# Altium footprint library ParsaLibrary.PcbLib: 526 footprints (part 14 of 33)
Each footprint in its own frame and in the unit in brackets; x right, y up, seen from the top. Pads: shape width x height; smd on the part's side, far side on the other; paste and mask are expansions set on the pad; w line width, h text height; cw(c..) or ccw(c..) is an arc to the next point about the centre after c.
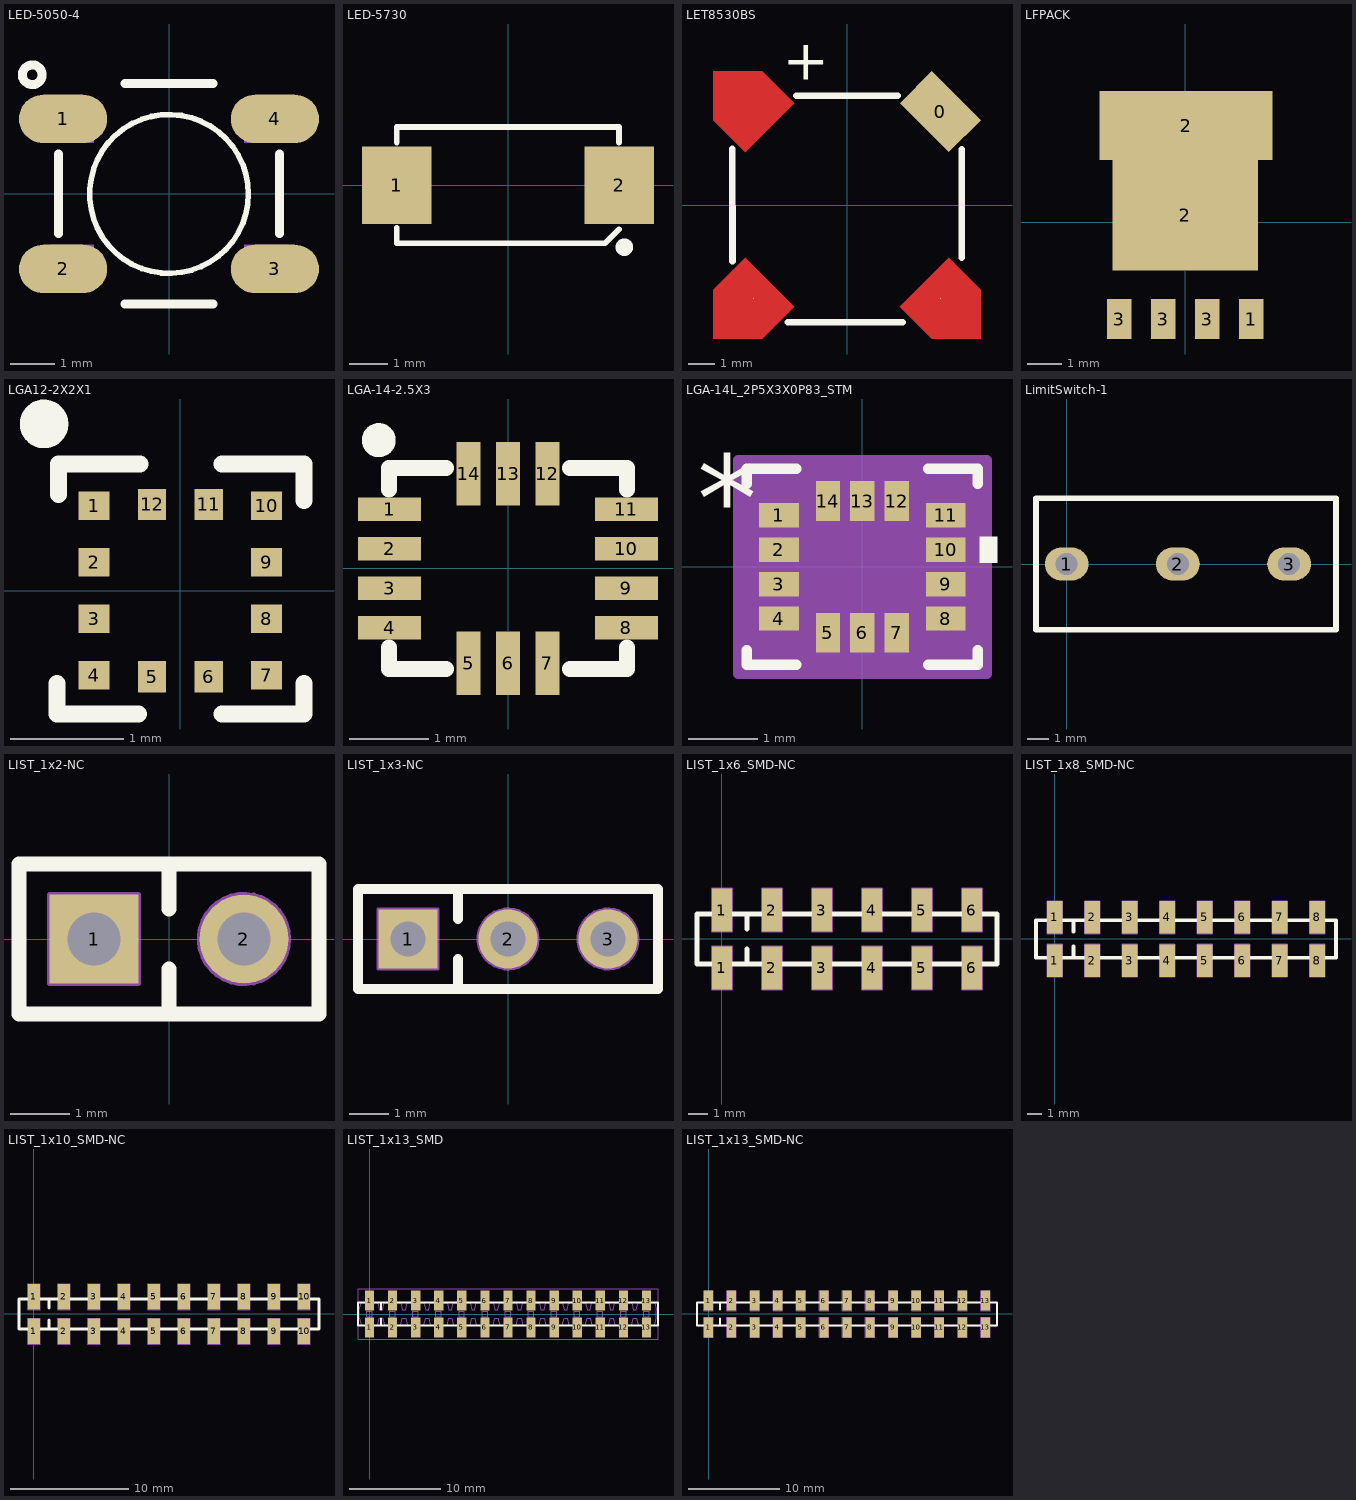
[diagram p13: the footprints below, top view; thin cyan lines are the x and y axes]

## LED-5050-4 [mm]
pads (4):
  rrect100% 2x1.1 smd: 1(-2.4,1.7) 2(-2.4,-1.7) 3(2.4,-1.7) 4(2.4,1.7)
Top Overlay:
  circle w0.203: c-3.1,2.7 r0.224
  circle w0.127: c0,0 r1.8
  lines w0.203: -2.5,-0.9 -2.5,-0.7 -2.5,0.9 ; -1,-2.5 1,-2.5 ; -1,2.5 1,2.5 ; 2.5,-0.9 2.5,-0.7 2.5,0.9
Mechanical 16:
  rectangle: 1.7,1.15 2.7,2.05
  rectangle: 1.7,-2.05 2.7,-1.15
  region: -1.7,2.05 -2.7,2.05 -2.7,1.15 -1.7,1.15
  region: -1.7,-1.15 -2.7,-1.15 -2.7,-2.05 -1.7,-2.05
3D body "User Library-ws2812B-1.step": height 1.6, standoff 0.03, extent -2.7,-2.5 2.7,2.5

## LED-5730 [mm]
pads (2):
  rect 1.8x2 smd: 1(-2.867,0) 2(2.867,0)
Top Overlay:
  circle w0.254: c3,-1.6 r0.1
  lines w0.15: -2.867,-1.1 -2.867,-1.5 2.5,-1.5 2.862,-1.138 ; -2.867,1.1 -2.867,1.5 2.862,1.5 2.862,1.1
Top Solder:
  rectangle: -1.7,-0.8 0.9,0.8
3D body "User Library-PLCC-2white.step": height 0.9, standoff 0, extent -2.85,-1.5 2.85,1.5

## Lens-Holder [mm]
3D body "Camera ABM-S420.SLDPRT": height 25, standoff -6, extent -16.76,-14.732 15.24,17.268

## LET8530BS [mm]
pads (4):
  round 0.025 smd: 0(3.5,-3.5) 1(-3.5,-3.5) 2(-3.5,3.5)
  rect 2.6x1.7 smd rot 135: 0(3.5,3.5)
Top Layer:
  region: 5.02,-3.182 5.02,-5.021 3.182,-5.02 1.98,-3.818 3.818,-1.98
  region: -3.182,-5.02 -5.021,-5.02 -5.02,-3.182 -3.818,-1.98 -1.98,-3.818
  region: -5.02,3.182 -5.02,5.02 -3.182,5.02 -1.98,3.818 -3.818,1.98
Top Overlay:
  lines w0.254: -4.3,2.1 -4.293,-2.108 ; -2.21,-4.394 2.083,-4.394 ; -1.9,4.1 1.9,4.1 ; 4.301,-1.975 4.301,2.091
  text "+" at -2.4,4.7 h1.52
3D body "GSC8530YA-16R2700.STEP": height 3, standoff -0.15, extent -4.25,-4.25 4.3,4.25

## LFPACK [mm]
pads (6):
  rect 0.7x1.15 smd: 1(1.905,-2.794) 3(-1.905,-2.794) 3(-0.635,-2.794) 3(0.635,-2.794)
  rect 4.2x3.2 smd: 2(0,0.206)
  rect 5x2 smd: 2(0.025,2.794)
3D body "lfpak.STEP": height 1.1, standoff -0.01, extent -2.485,-3.126 2.515,3.343

## LGA12-2X2X1 [mm]
height 1
pads (12):
  rect 0.275x0.25 smd: 1(-0.762,0.75) 2(-0.762,0.25) 3(-0.762,-0.25) 4(-0.762,-0.75) 7(0.763,-0.75) 8(0.763,-0.25) 9(0.763,0.25) 10(0.763,0.75)
  rect 0.25x0.275 smd: 5(-0.25,-0.763) 6(0.25,-0.763) 11(0.25,0.763) 12(-0.25,0.763)
Top Overlay:
  circle w0.254: c-1.206,1.473 r0.088
  lines w0.15: -1.092,-0.82 -1.092,-1.092 -0.37,-1.092 ; -1.078,0.848 -1.078,1.12 -0.356,1.12 ; 0.37,-1.092 1.092,-1.092 1.092,-0.82 ; 0.37,1.118 1.092,1.118 1.092,0.796
3D body "User Library-LGA12_2x2_E0P5.step": height 0.7, standoff 0, extent -1,-1 1,1

## LGA-14-2.5X3 [mm]
pads (14):
  rect 0.8x0.3 smd: 1(-1.5,0.75) 2(-1.5,0.25) 3(-1.5,-0.25) 4(-1.5,-0.75) 8(1.5,-0.75) 9(1.5,-0.25) 10(1.5,0.25) 11(1.5,0.75)
  rect 0.3x0.8 smd: 5(-0.5,-1.2) 6(0,-1.2) 7(0.5,-1.2) 12(0.5,1.2) 13(0,1.2) 14(-0.5,1.2)
Top Overlay:
  circle w0.254: c-1.637,1.625 r0.088
  lines w0.2: -1.509,-1 -1.509,-1.272 -0.787,-1.272 ; -1.509,1 -1.509,1.272 -0.787,1.272 ; 0.787,-1.272 1.509,-1.272 1.509,-1 ; 0.787,1.272 1.509,1.272 1.509,1
3D body "User Library-LGA-14 2_5x3-1.step": height 0.9, standoff 0.04, extent -1.509,-1.245 1.491,1.255

## LGA-14L_2P5X3X0P83_STM [mm]
pads (14):
  rect 0.577x0.352 smd paste+0 mask+0.102: 1(-1.21,0.75) 2(-1.21,0.25) 3(-1.21,-0.25) 4(-1.21,-0.75) 8(1.21,-0.75) 9(1.21,-0.25) 10(1.21,0.25) 11(1.21,0.75)
  rect 0.352x0.577 smd paste+0 mask+0.102: 5(-0.5,-0.956) 6(0,-0.956) 7(0.5,-0.956) 12(0.5,0.956) 13(0,0.956) 14(-0.5,0.956)
Top Overlay:
  region: 1.702,0.44 1.956,0.44 1.956,0.059 1.702,0.059
  lines w0.152: -1.676,-1.207 -1.676,-1.422 -0.957,-1.422 ; -1.676,1.207 -1.676,1.422 -0.957,1.422 ; 0.957,-1.422 1.676,-1.422 1.676,-1.207 ; 0.957,1.422 1.676,1.422 1.676,1.207
  text "*" at -2.4,0.365 h1.27
Mechanical 13:
  lines w0.025: -1.549,0.025 -0.279,1.295 ; -1.549,-1.295 1.549,-1.295 1.549,1.295 -1.549,1.295 -1.549,-1.295 ; -1.549,-0.875 -1.549,-0.625 -1.448,-0.625 -1.448,-0.875 -1.549,-0.875 ; -1.549,-0.375 -1.549,-0.125 -1.448,-0.125 -1.448,-0.375 -1.549,-0.375 ; -1.549,0.125 -1.549,0.375 -1.448,0.375 -1.448,0.125 -1.549,0.125 ; -1.549,0.625 -1.549,0.875 -1.448,0.875 -1.448,0.625 -1.549,0.625 ; -0.625,-1.295 -0.375,-1.295 -0.375,-1.194 -0.625,-1.194 -0.625,-1.295 ; -0.625,1.194 -0.375,1.194 -0.375,1.295 -0.625,1.295 -0.625,1.194 ; -0.125,-1.295 0.125,-1.295 0.125,-1.194 -0.125,-1.194 -0.125,-1.295 ; -0.125,1.194 0.125,1.194 0.125,1.295 -0.125,1.295 -0.125,1.194 ; 0.375,-1.295 0.625,-1.295 0.625,-1.194 0.375,-1.194 0.375,-1.295 ; 0.375,1.194 0.625,1.194 0.625,1.295 0.375,1.295 0.375,1.194 ; 1.448,-0.875 1.549,-0.875 1.549,-0.625 1.448,-0.625 1.448,-0.875 ; 1.448,-0.375 1.549,-0.375 1.549,-0.125 1.448,-0.125 1.448,-0.375 ; 1.448,0.125 1.549,0.125 1.549,0.375 1.448,0.375 1.448,0.125 ; 1.448,0.625 1.549,0.625 1.549,0.875 1.448,0.875 1.448,0.625
  text "*" at -1.29,0.365 h1.27
Mechanical 15:
  region: -0.879,-1.549 -1.803,-1.549 -1.803,-1.129 -1.803,1.129 -1.803,1.549 -0.879,1.549 0.879,1.549 1.803,1.549 1.803,1.129 1.803,-1.129 1.803,-1.549 0.879,-1.549
  lines w0.152: -1.803,-1.549 -1.803,-1.129 -1.803,1.129 -1.803,1.549 -0.879,1.549 0.879,1.549 1.803,1.549 1.803,1.129 1.803,-1.129 1.803,-1.549 0.879,-1.549 -0.879,-1.549 -1.803,-1.549
3D body "LGA-14L_2P5X3X0P83_STM.step": height 0.87, standoff 0, extent -1.549,-1.295 1.549,1.295

## LimitSwitch-1 [mm] "12mmx12mm"
height 10
pads (3):
  oval 2x1.5 hole 1: 1(0,0) 2(5.08,0) 3(10.16,0)
Top Overlay:
  lines w0.254: -1.4,-3 12.3,-3 12.3,3 -1.4,3 -1.4,-3
3D body "D2F-01L.STEP": height 8.93, standoff -5, extent -1.32,-2.9 12.202,2.9

## LIST_1x2-NC [mm]
pads (2):
  rect 1.5x1.5 hole 0.9: 1(-1.27,0)
  round 1.5 hole 0.9: 2(1.27,0)
Top Overlay:
  lines w0.254: 0,-1.27 0,-0.508 ; 0,0.508 0,1.27 ; -2.54,-1.27 2.54,-1.27 2.54,1.27 -2.54,1.27 -2.54,-1.27
Mechanical 7:
  circle w0.1: c1.27,0 r0.75
  circle w0.1: c1.27,0 r0.45
  circle w0.1: c-1.27,0 r0.45
  lines w0.1: 0,-1.27 0,-0.508 ; 0,0.508 0,1.27 ; -2.54,-1.27 2.54,-1.27 2.54,1.27 -2.54,1.27 -2.54,-1.27 ; -2.02,-0.75 -0.52,-0.75 -0.52,0.75 -2.02,0.75 -2.02,-0.75
  text ".Designator" at -0.4,-0.2 h0.38
Mechanical 8:
  circle w0.1: c-1.27,0 r0.45
  circle w0.1: c1.27,0 r0.45
  circle w0.1: c1.27,0 r0.75
  lines w0.1: -2.02,-0.75 -2.02,0.75 -0.52,0.75 -0.52,-0.75 -2.02,-0.75

## LIST_1x3-NC [mm]
pads (3):
  rect 1.5x1.5 hole 0.9: 1(-2.54,0)
  round 1.5 hole 0.9: 2(0,0) 3(2.54,0)
Top Overlay:
  lines w0.254: -1.27,-1.27 -1.27,-0.508 ; -1.27,0.508 -1.27,1.27 ; -3.81,-1.27 -3.81,1.27 3.81,1.27 3.81,-1.27 -3.81,-1.27
Mechanical 7:
  circle w0.1: c0,0 r0.75
  circle w0.1: c0,0 r0.45
  circle w0.1: c-2.54,0 r0.45
  circle w0.1: c2.54,0 r0.45
  circle w0.1: c2.54,0 r0.75
  lines w0.1: -1.27,-1.27 -1.27,-0.508 ; -1.27,0.508 -1.27,1.27 ; -3.81,-1.27 -3.81,1.27 3.81,1.27 3.81,-1.27 -3.81,-1.27 ; -3.29,-0.75 -1.79,-0.75 -1.79,0.75 -3.29,0.75 -3.29,-0.75
  text ".Designator" at -2.04,-0.2 h0.38

## LIST_1x6_SMD-NC [mm]
pads (12):
  rect 1.02x2.19 smd paste+0: 1(0,-1.465) 1(0,1.465) 2(2.54,-1.465) 2(2.54,1.465) 3(5.08,-1.465) 3(5.08,1.465) 4(7.62,-1.465) 4(7.62,1.465) 5(10.16,-1.465) 5(10.16,1.465) 6(12.7,-1.465) 6(12.7,1.465)
Top Overlay:
  lines w0.254: 1.27,-1.27 1.27,-0.508 ; 1.27,0.508 1.27,1.27 ; -1.27,-1.27 -1.27,1.27 13.97,1.27 13.97,-1.27 -1.27,-1.27
Mechanical 7:
  lines w0.1: -0.686,-1.27 -1.27,-1.27 -1.27,1.27 -0.686,1.27 ; 0.686,-1.27 1.854,-1.27 ; 0.686,1.27 1.854,1.27 ; 1.27,-1.27 1.27,-0.508 ; 1.27,0.508 1.27,1.27 ; 3.226,-1.27 4.394,-1.27 ; 3.226,1.27 4.394,1.27 ; 5.766,-1.27 6.934,-1.27 ; 5.766,1.27 6.934,1.27 ; 8.306,-1.27 9.474,-1.27 ; 8.306,1.27 9.474,1.27 ; 10.846,-1.27 12.014,-1.27 ; 10.846,1.27 12.014,1.27 ; 13.386,-1.27 13.97,-1.27 13.97,1.27 13.386,1.27 ; -0.51,-2.56 -0.51,-0.37 0.51,-0.37 0.51,-2.56 -0.51,-2.56 ; -0.51,0.37 0.51,0.37 0.51,2.56 -0.51,2.56 -0.51,0.37 ; 2.03,-2.56 2.03,-0.37 3.05,-0.37 3.05,-2.56 2.03,-2.56 ; 2.03,0.37 2.03,2.56 3.05,2.56 3.05,0.37 2.03,0.37 ; 4.57,-2.56 4.57,-0.37 5.59,-0.37 5.59,-2.56 4.57,-2.56 ; 4.57,0.37 4.57,2.56 5.59,2.56 5.59,0.37 4.57,0.37 ; 7.11,-2.56 7.11,-0.37 8.13,-0.37 8.13,-2.56 7.11,-2.56 ; 7.11,0.37 7.11,2.56 8.13,2.56 8.13,0.37 7.11,0.37 ; 9.65,-2.56 9.65,-0.37 10.67,-0.37 10.67,-2.56 9.65,-2.56 ; 9.65,0.37 9.65,2.56 10.67,2.56 10.67,0.37 9.65,0.37 ; 12.19,-2.56 12.19,-0.37 13.21,-0.37 13.21,-2.56 12.19,-2.56 ; 12.19,0.37 12.19,2.56 13.21,2.56 13.21,0.37 12.19,0.37
  text ".Designator" at 0.5,-0.2 h0.38

## LIST_1x8_SMD-NC [mm]
pads (16):
  rect 1.02x2.19 smd paste+0: 1(0,-1.465) 1(0,1.465) 2(2.54,-1.465) 2(2.54,1.465) 3(5.08,-1.465) 3(5.08,1.465) 4(7.62,-1.465) 4(7.62,1.465) 5(10.16,-1.465) 5(10.16,1.465) 6(12.7,-1.465) 6(12.7,1.465) 7(15.24,-1.465) 7(15.24,1.465) 8(17.78,-1.465) 8(17.78,1.465)
Top Overlay:
  lines w0.254: 1.27,-1.27 1.27,-0.508 ; 1.27,0.508 1.27,1.27 ; -1.27,-1.27 19.05,-1.27 19.05,1.27 -1.27,1.27 -1.27,-1.27
Mechanical 7:
  lines w0.1: -0.686,-1.27 -1.27,-1.27 -1.27,1.27 -0.686,1.27 ; 0.686,-1.27 1.854,-1.27 ; 0.686,1.27 1.854,1.27 ; 1.27,-1.27 1.27,-0.508 ; 1.27,0.508 1.27,1.27 ; 3.226,-1.27 4.394,-1.27 ; 3.226,1.27 4.394,1.27 ; 5.766,-1.27 6.934,-1.27 ; 5.766,1.27 6.934,1.27 ; 8.306,-1.27 9.474,-1.27 ; 8.306,1.27 9.474,1.27 ; 10.846,-1.27 12.014,-1.27 ; 10.846,1.27 12.014,1.27 ; 13.386,-1.27 14.554,-1.27 ; 13.386,1.27 14.554,1.27 ; 15.926,-1.27 17.094,-1.27 ; 15.926,1.27 17.094,1.27 ; 18.466,-1.27 19.05,-1.27 19.05,1.27 18.466,1.27 ; -0.51,-2.56 0.51,-2.56 0.51,-0.37 -0.51,-0.37 -0.51,-2.56 ; -0.51,0.37 -0.51,2.56 0.51,2.56 0.51,0.37 -0.51,0.37 ; 2.03,-2.56 3.05,-2.56 3.05,-0.37 2.03,-0.37 2.03,-2.56 ; 2.03,0.37 3.05,0.37 3.05,2.56 2.03,2.56 2.03,0.37 ; 4.57,-2.56 5.59,-2.56 5.59,-0.37 4.57,-0.37 4.57,-2.56 ; 4.57,0.37 5.59,0.37 5.59,2.56 4.57,2.56 4.57,0.37 ; 7.11,-2.56 8.13,-2.56 8.13,-0.37 7.11,-0.37 7.11,-2.56 ; 7.11,0.37 8.13,0.37 8.13,2.56 7.11,2.56 7.11,0.37 ; 9.65,-2.56 10.67,-2.56 10.67,-0.37 9.65,-0.37 9.65,-2.56 ; 9.65,0.37 10.67,0.37 10.67,2.56 9.65,2.56 9.65,0.37 ; 12.19,-2.56 13.21,-2.56 13.21,-0.37 12.19,-0.37 12.19,-2.56 ; 12.19,0.37 13.21,0.37 13.21,2.56 12.19,2.56 12.19,0.37 ; 14.73,-2.56 15.75,-2.56 15.75,-0.37 14.73,-0.37 14.73,-2.56 ; 14.73,0.37 15.75,0.37 15.75,2.56 14.73,2.56 14.73,0.37 ; 17.27,-2.56 18.29,-2.56 18.29,-0.37 17.27,-0.37 17.27,-2.56 ; 17.27,0.37 18.29,0.37 18.29,2.56 17.27,2.56 17.27,0.37
  text ".Designator" at 0.5,-0.2 h0.38

## LIST_1x10_SMD-NC [mm]
pads (20):
  rect 1.02x2.19 smd paste+0: 1(0,-1.465) 1(0,1.465) 2(2.54,-1.465) 2(2.54,1.465) 3(5.08,-1.465) 3(5.08,1.465) 4(7.62,-1.465) 4(7.62,1.465) 5(10.16,-1.465) 5(10.16,1.465) 6(12.7,-1.465) 6(12.7,1.465) 7(15.24,-1.465) 7(15.24,1.465) 8(17.78,-1.465) 8(17.78,1.465) 9(20.32,-1.465) 9(20.32,1.465) 10(22.86,-1.465) 10(22.86,1.465)
Top Overlay:
  lines w0.254: 1.27,-1.27 1.27,-0.508 ; 1.27,0.508 1.27,1.27 ; -1.27,-1.27 -1.27,1.27 24.13,1.27 24.13,-1.27 -1.27,-1.27
Mechanical 7:
  lines w0.1: -0.686,-1.27 -1.27,-1.27 -1.27,1.27 -0.686,1.27 ; 0.686,-1.27 1.854,-1.27 ; 0.686,1.27 1.854,1.27 ; 1.27,-1.27 1.27,-0.508 ; 1.27,0.508 1.27,1.27 ; 3.226,-1.27 4.394,-1.27 ; 3.226,1.27 4.394,1.27 ; 5.766,-1.27 6.934,-1.27 ; 5.766,1.27 6.934,1.27 ; 8.306,-1.27 9.474,-1.27 ; 8.306,1.27 9.474,1.27 ; 10.846,-1.27 12.014,-1.27 ; 10.846,1.27 12.014,1.27 ; 13.386,-1.27 14.554,-1.27 ; 13.386,1.27 14.554,1.27 ; 15.926,-1.27 17.094,-1.27 ; 15.926,1.27 17.094,1.27 ; 18.466,-1.27 19.634,-1.27 ; 18.466,1.27 19.634,1.27 ; 21.006,-1.27 22.174,-1.27 ; 21.006,1.27 22.174,1.27 ; 23.546,-1.27 24.13,-1.27 24.13,1.27 23.546,1.27 ; -0.51,-2.56 -0.51,-0.37 0.51,-0.37 0.51,-2.56 -0.51,-2.56 ; -0.51,0.37 0.51,0.37 0.51,2.56 -0.51,2.56 -0.51,0.37 ; 2.03,-2.56 2.03,-0.37 3.05,-0.37 3.05,-2.56 2.03,-2.56 ; 2.03,0.37 2.03,2.56 3.05,2.56 3.05,0.37 2.03,0.37 ; 4.57,-2.56 4.57,-0.37 5.59,-0.37 5.59,-2.56 4.57,-2.56 ; 4.57,0.37 4.57,2.56 5.59,2.56 5.59,0.37 4.57,0.37 ; 7.11,-2.56 7.11,-0.37 8.13,-0.37 8.13,-2.56 7.11,-2.56 ; 7.11,0.37 7.11,2.56 8.13,2.56 8.13,0.37 7.11,0.37 ; 9.65,-2.56 9.65,-0.37 10.67,-0.37 10.67,-2.56 9.65,-2.56 ; 9.65,0.37 9.65,2.56 10.67,2.56 10.67,0.37 9.65,0.37 ; 12.19,-2.56 12.19,-0.37 13.21,-0.37 13.21,-2.56 12.19,-2.56 ; 12.19,0.37 12.19,2.56 13.21,2.56 13.21,0.37 12.19,0.37 ; 14.73,-2.56 14.73,-0.37 15.75,-0.37 15.75,-2.56 14.73,-2.56 ; 14.73,0.37 14.73,2.56 15.75,2.56 15.75,0.37 14.73,0.37 ; 17.27,-2.56 17.27,-0.37 18.29,-0.37 18.29,-2.56 17.27,-2.56 ; 17.27,0.37 17.27,2.56 18.29,2.56 18.29,0.37 17.27,0.37 ; 19.81,-2.56 20.83,-2.56 20.83,-0.37 19.81,-0.37 19.81,-2.56 ; 19.81,0.37 20.83,0.37 20.83,2.56 19.81,2.56 19.81,0.37 ; 22.35,-2.56 23.37,-2.56 23.37,-0.37 22.35,-0.37 22.35,-2.56 ; 22.35,0.37 23.37,0.37 23.37,2.56 22.35,2.56 22.35,0.37
  text ".Designator" at 0.5,-0.2 h0.38

## LIST_1x13_SMD [mm]
pads (26):
  rect 1.02x2.19 smd: 1(0,-1.465) 1(0,1.465) 2(2.54,-1.465) 2(2.54,1.465) 3(5.08,-1.465) 3(5.08,1.465) 4(7.62,-1.465) 4(7.62,1.465) 5(10.16,-1.465) 5(10.16,1.465) 6(12.7,-1.465) 6(12.7,1.465) 7(15.24,-1.465) 7(15.24,1.465) 8(17.78,-1.465) 8(17.78,1.465) 9(20.32,-1.465) 9(20.32,1.465) 10(22.86,-1.465) 10(22.86,1.465) 11(25.4,-1.465) 11(25.4,1.465) 12(27.94,-1.465) 12(27.94,1.465) 13(30.48,-1.465) 13(30.48,1.465)
Top Overlay:
  lines w0.254: 1.27,-1.27 1.27,-0.508 ; 1.27,0.508 1.27,1.27 ; -1.27,-1.27 31.75,-1.27 31.75,1.27 -1.27,1.27 -1.27,-1.27
Mechanical 7:
  drawing of 195 lines, arcs and shapes, not listed
  text ".Designator" at 0.5,-0.2 h0.38
Mechanical 15:
  lines w0.1: -1.27,-2.8 -1.27,2.8 31.75,2.8 31.75,-2.8 -1.27,-2.8
3D body "pin_header_a-sl254-eg-g13mp1.stp": height 9.82, standoff -0.02, extent -1.27,-2.5 31.75,2.5

## LIST_1x13_SMD-NC [mm]
pads (26):
  rect 1.02x2.19 smd: 1(0,-1.465) 1(0,1.465) 2(2.54,-1.465) 2(2.54,1.465) 3(5.08,-1.465) 3(5.08,1.465) 4(7.62,-1.465) 4(7.62,1.465) 5(10.16,-1.465) 5(10.16,1.465) 6(12.7,-1.465) 6(12.7,1.465) 7(15.24,-1.465) 7(15.24,1.465) 8(17.78,-1.465) 8(17.78,1.465) 9(20.32,-1.465) 9(20.32,1.465) 10(22.86,-1.465) 10(22.86,1.465) 11(25.4,-1.465) 11(25.4,1.465) 12(27.94,-1.465) 12(27.94,1.465) 13(30.48,-1.465) 13(30.48,1.465)
Top Overlay:
  lines w0.254: 1.27,-1.27 1.27,-0.508 ; 1.27,0.508 1.27,1.27 ; -1.27,-1.27 31.75,-1.27 31.75,1.27 -1.27,1.27 -1.27,-1.27
Mechanical 7:
  lines w0.1: -0.686,-1.27 -1.27,-1.27 -1.27,1.27 -0.686,1.27 ; 0.686,-1.27 1.854,-1.27 ; 0.686,1.27 1.854,1.27 ; 1.27,-1.27 1.27,-0.508 ; 1.27,0.508 1.27,1.27 ; 3.226,-1.27 4.394,-1.27 ; 3.226,1.27 4.394,1.27 ; 5.766,-1.27 6.934,-1.27 ; 5.766,1.27 6.934,1.27 ; 8.306,-1.27 9.474,-1.27 ; 8.306,1.27 9.474,1.27 ; 10.846,-1.27 12.014,-1.27 ; 10.846,1.27 12.014,1.27 ; 13.386,-1.27 14.554,-1.27 ; 13.386,1.27 14.554,1.27 ; 15.926,-1.27 17.094,-1.27 ; 15.926,1.27 17.094,1.27 ; 18.466,-1.27 19.634,-1.27 ; 18.466,1.27 19.634,1.27 ; 21.006,-1.27 22.174,-1.27 ; 21.006,1.27 22.174,1.27 ; 23.546,-1.27 24.714,-1.27 ; 23.546,1.27 24.714,1.27 ; 26.086,-1.27 27.254,-1.27 ; 26.086,1.27 27.254,1.27 ; 28.626,-1.27 29.794,-1.27 ; 28.626,1.27 29.794,1.27 ; 31.166,-1.27 31.75,-1.27 31.75,1.27 31.166,1.27 ; -0.51,-2.56 0.51,-2.56 0.51,-0.37 -0.51,-0.37 -0.51,-2.56 ; -0.51,0.37 -0.51,2.56 0.51,2.56 0.51,0.37 -0.51,0.37 ; 2.03,-2.56 3.05,-2.56 3.05,-0.37 2.03,-0.37 2.03,-2.56 ; 2.03,0.37 3.05,0.37 3.05,2.56 2.03,2.56 2.03,0.37 ; 4.57,-2.56 5.59,-2.56 5.59,-0.37 4.57,-0.37 4.57,-2.56 ; 4.57,0.37 5.59,0.37 5.59,2.56 4.57,2.56 4.57,0.37 ; 7.11,-2.56 8.13,-2.56 8.13,-0.37 7.11,-0.37 7.11,-2.56 ; 7.11,0.37 8.13,0.37 8.13,2.56 7.11,2.56 7.11,0.37 ; 9.65,-2.56 10.67,-2.56 10.67,-0.37 9.65,-0.37 9.65,-2.56 ; 9.65,0.37 10.67,0.37 10.67,2.56 9.65,2.56 9.65,0.37 ; 12.19,-2.56 13.21,-2.56 13.21,-0.37 12.19,-0.37 12.19,-2.56 ; 12.19,0.37 13.21,0.37 13.21,2.56 12.19,2.56 12.19,0.37 ; 14.73,-2.56 15.75,-2.56 15.75,-0.37 14.73,-0.37 14.73,-2.56 ; 14.73,0.37 15.75,0.37 15.75,2.56 14.73,2.56 14.73,0.37 ; 17.27,-2.56 18.29,-2.56 18.29,-0.37 17.27,-0.37 17.27,-2.56 ; 17.27,0.37 18.29,0.37 18.29,2.56 17.27,2.56 17.27,0.37 ; 19.81,-2.56 19.81,-0.37 20.83,-0.37 20.83,-2.56 19.81,-2.56 ; 19.81,0.37 19.81,2.56 20.83,2.56 20.83,0.37 19.81,0.37 ; 22.35,-2.56 22.35,-0.37 23.37,-0.37 23.37,-2.56 22.35,-2.56 ; 22.35,0.37 22.35,2.56 23.37,2.56 23.37,0.37 22.35,0.37 ; 24.89,-2.56 24.89,-0.37 25.91,-0.37 25.91,-2.56 24.89,-2.56 ; 24.89,0.37 24.89,2.56 25.91,2.56 25.91,0.37 24.89,0.37 ; 27.43,-2.56 27.43,-0.37 28.45,-0.37 28.45,-2.56 27.43,-2.56 ; 27.43,0.37 27.43,2.56 28.45,2.56 28.45,0.37 27.43,0.37 ; 29.97,-2.56 30.99,-2.56 30.99,-0.37 29.97,-0.37 29.97,-2.56 ; 29.97,0.37 30.99,0.37 30.99,2.56 29.97,2.56 29.97,0.37
  text ".Designator" at 0.5,-0.2 h0.38